# Altium footprint library Fleet-Monitor.PcbLib: 30 footprints (part 1 of 2)
Each footprint in its own frame and in the unit in brackets; x right, y up, seen from the top. Pads: shape width x height; smd on the part's side, far side on the other; paste and mask are expansions set on the pad; w line width, h text height; cw(c..) or ccw(c..) is an arc to the next point about the centre after c.
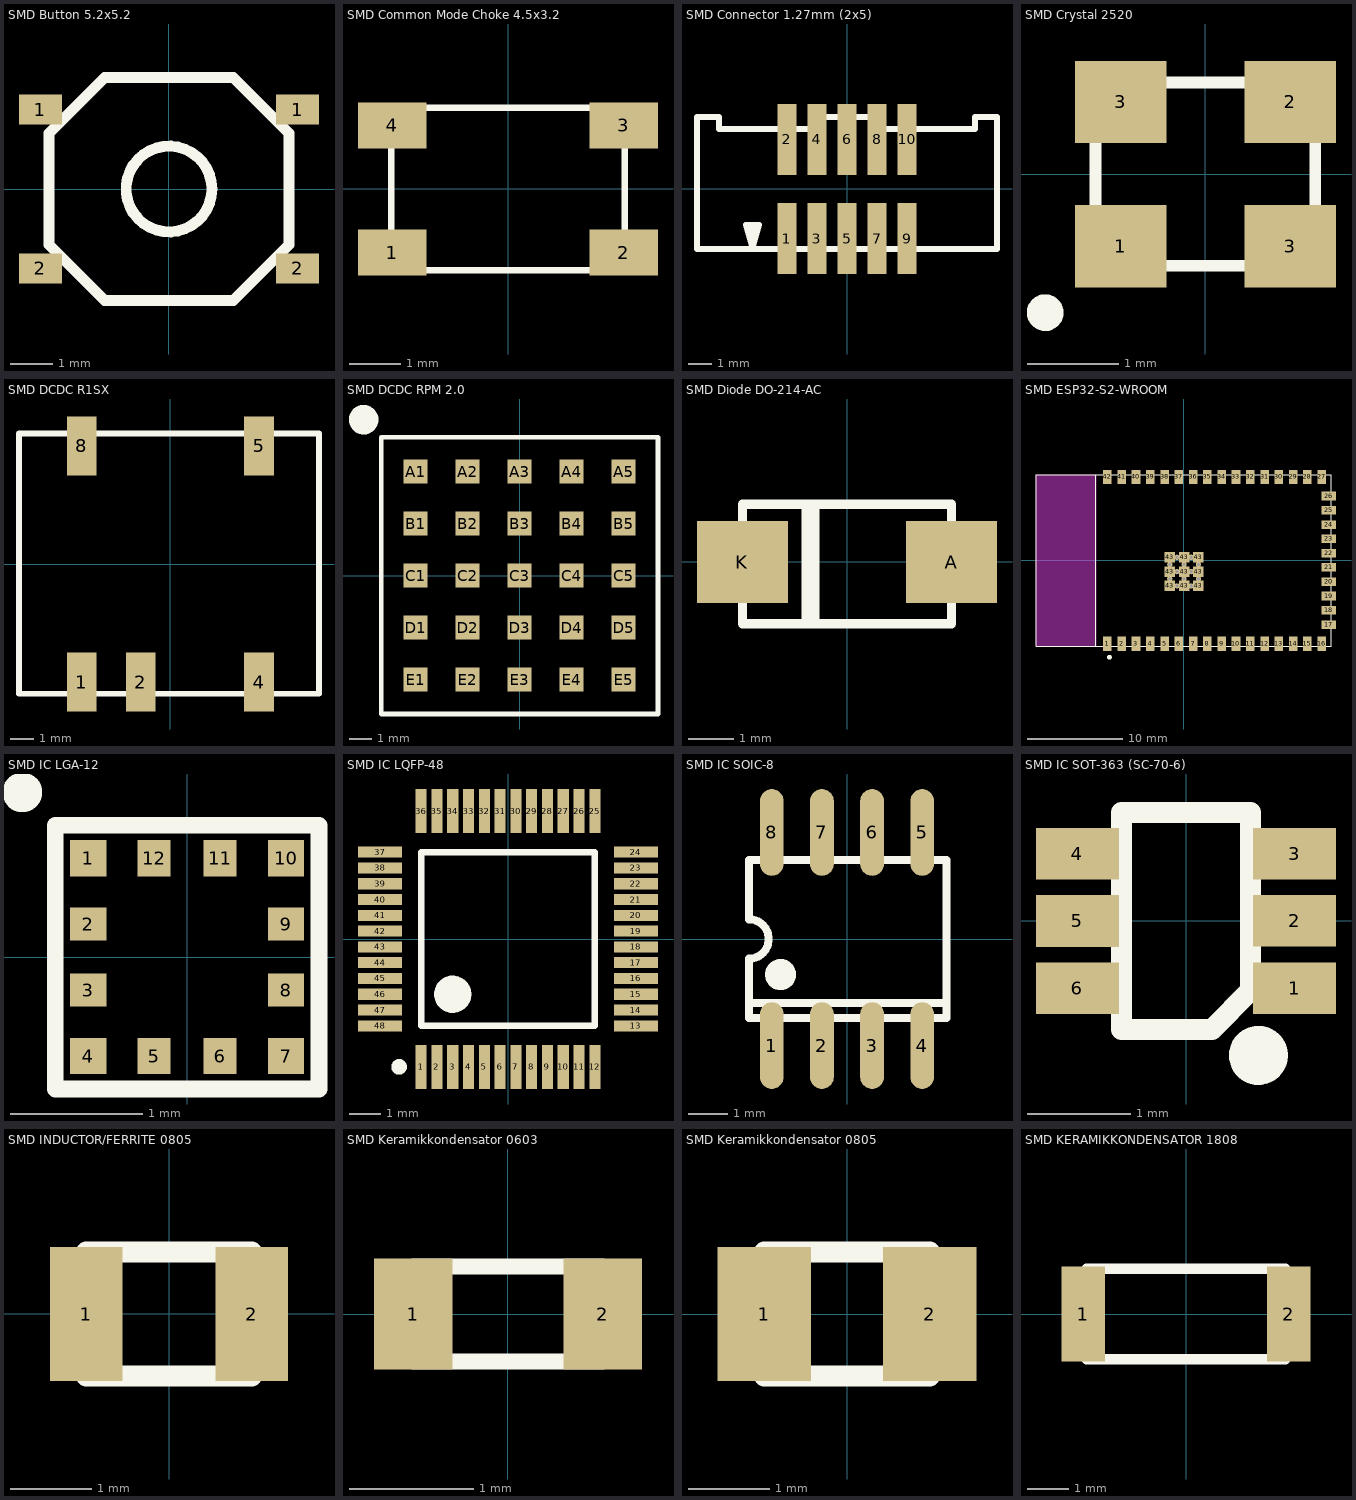
[diagram p0: the footprints below, top view; thin cyan lines are the x and y axes]

## SMD Button 5.2x5.2 [mm]
pads (4):
  rect 1x0.7 smd: 1(-3,1.85) 1(3,1.85) 2(-3,-1.85) 2(3,-1.85)
Top Overlay:
  circle w0.254: c0,0 r1
  lines w0.254: -2.8,-1.3 -1.5,-2.6 0,-2.6 1.5,-2.6 2.8,-1.3 2.8,0 2.8,1.3 1.5,2.6 0,2.6 -1.5,2.6 -2.8,1.3 -2.8,0 -2.8,-1.3
3D body "User Library-LP16.step": height 1.5, standoff 0, extent -3.2,-2.55 3.2,2.55

## SMD Common Mode Choke 4.5x3.2 [mm]
height 1.7
pads (4):
  rect 1.35x0.9 smd: 1(-2.275,-1.25) 2(2.275,-1.25) 3(2.275,1.25) 4(-2.275,1.25)
Top Overlay:
  lines w0.127: -2.3,-1.6 2.3,-1.6 2.3,1.6 -2.3,1.6 -2.3,-1.6
3D body "User Library-ACT45B_GERMANY.step": height 3, standoff 0, extent -2.25,-1.6 2.25,1.6

## SMD Connector 1.27mm (2x5) [mm]
pads (10):
  rect 0.8x3 smd mask+0.051: 1(-2.54,-2.1) 2(-2.54,2.1) 3(-1.27,-2.1) 4(-1.27,2.1) 5(0,-2.1) 6(0,2.1) 7(1.27,-2.1) 8(1.27,2.1) 9(2.54,-2.1) 10(2.54,2.1)
Top Overlay:
  lines w0.203: -4.1,-2 -4.032,-1.962 -3.9,-1.5 ; -4.1,-1.5 -3.902,-2.2 ; -4.3,-1.5 -4,-2.54 -3.7,-1.5 -4.3,-1.5
  lines w0.254: -6.35,-2.54 6.35,-2.54 6.35,3.048 5.41,3.048 5.41,2.54 1.27,2.54 1.27,3.048 -1.27,3.048 -1.27,2.54 -5.41,2.54 -5.41,3.048 -6.35,3.048 -6.35,-2.54
3D body "SHF_105_01_L_D_SM.STEP": height 5.45, standoff -0.01, extent -6.35,-3.048 6.35,3.048

## SMD Crystal 2520 [mm]
height 1.7
pads (4):
  rect 1x0.9 smd: 1(-0.925,-0.787) 2(0.925,0.788) 3(-0.925,0.788) 3(0.925,-0.787)
Top Overlay:
  circle w0.2: c-1.75,-1.512 r0.1
  lines w0.127: -1.2,-1 1.2,-1 1.2,1 -1.2,1 -1.2,-1
3D body "2520 SMD Crystal Oscillator.STEP": height 0.7, standoff 0, extent -1.25,-1 1.25,1

## SMD DCDC R1SX [mm]
height 1.7
pads (5):
  rect 1.27x2.54 smd: 1(-3.81,-5.08) 2(-1.27,-5.08) 4(3.81,-5.08) 5(3.81,5.08) 8(-3.81,5.08)
Top Overlay:
  lines w0.254: -6.51,-5.58 -6.51,5.62 6.39,5.62 6.39,-5.58 -6.51,-5.58
3D body "R1SX.step": height 5.9, standoff 0, extent -6.425,-5.6 6.425,5.6

## SMD DCDC RPM 2.0 [mm]
height 1.7
pads (25):
  rect 1.06x1.06 smd: A1(-4.58,4.58) A2(-2.29,4.58) A3(0,4.58) A4(2.29,4.58) A5(4.58,4.58) B1(-4.58,2.29) B2(-2.29,2.29) B3(0,2.29) B4(2.29,2.29) B5(4.58,2.29) C1(-4.58,0) C2(-2.29,0) C3(0,0) C4(2.29,0) C5(4.58,0) D1(-4.58,-2.29) D2(-2.29,-2.29) D3(0,-2.29) D4(2.29,-2.29) D5(4.58,-2.29) E1(-4.58,-4.58) E2(-2.29,-4.58) E3(0,-4.58) E4(2.29,-4.58) E5(4.58,-4.58)
Top Overlay:
  circle w0.8: c-6.87,6.87 r0.25
  lines w0.2: -6.095,-6.095 6.095,-6.095 6.095,6.095 -6.095,6.095 -6.095,-6.095
3D body "RPMB-3.0.STEP": height 3.95, standoff -0.02, extent -6.345,-6.195 6.345,6.195

## SMD Diode DO-214-AC [mm] "SM LED; 2 Flat Leads"
height 1.3
pads (2):
  rect 2x1.8 smd: A(2.3,0) K(-2.3,0)
Top Overlay:
  lines w0.2: -0.9,-1.328 -0.9,1.2 ; -0.8,-1.328 -0.8,1.2 ; -0.7,-1.328 -0.7,1.2 ; -2.3,-1.358 2.3,-1.358 2.3,1.27 -2.3,1.27 -2.3,-1.358
3D body "User Library-S1G-1.step": height 2.7, standoff 0, extent -2.8,-1.475 2.8,1.475

## SMD ESP32-S2-WROOM [mm]
height 1.7
pads (63):
  rect 0.9x1.5 smd: 1(-8,-8.75) 2(-6.5,-8.75) 3(-5,-8.75) 4(-3.5,-8.75) 5(-2,-8.75) 6(-0.5,-8.75) 7(1,-8.75) 8(2.5,-8.75) 9(4,-8.75) 10(5.5,-8.75) 11(7,-8.75) 12(8.5,-8.75) 13(10,-8.75) 14(11.5,-8.75) 15(13,-8.75) 16(14.5,-8.75) 27(14.5,8.75) 28(13,8.75) 29(11.5,8.75) 30(10,8.75) 31(8.5,8.75) 32(7,8.75) 33(5.5,8.75) 34(4,8.75) 35(2.5,8.75) 36(1,8.75) 37(-0.5,8.75) 38(-2,8.75) 39(-3.5,8.75) 40(-5,8.75) 41(-6.5,8.75) 42(-8,8.75)
  rect 1.5x0.9 smd: 17(15.25,-6.75) 18(15.25,-5.25) 19(15.25,-3.75) 20(15.25,-2.25) 21(15.25,-0.75) 22(15.25,0.75) 23(15.25,2.25) 24(15.25,3.75) 25(15.25,5.25) 26(15.25,6.75)
  rect 1.1x1.1 smd: 43(-1.45,-2.69) 43(-1.45,-1.19) 43(-1.45,0.31) 43(0.05,-2.69) 43(0.05,-1.19) 43(0.05,0.31) 43(1.55,-2.69) 43(1.55,-1.19) 43(1.55,0.31)
  round 0.55 hole 0.3 mask+0.102: 43(-1.45,-1.94) 43(-1.45,-0.44) 43(-0.7,-2.69) 43(-0.7,-1.19) 43(-0.7,0.31) 43(0.05,-1.94) 43(0.05,-0.44) 43(0.8,-2.69) 43(0.8,-1.19) 43(0.8,0.31) 43(1.55,-1.94) 43(1.55,-0.44)
Top Overlay:
  circle w0.3: c-7.788,-10.177 r0.1
  lines w0.127: -9.2,-8.96 -9.2,9 ; -9.2,9 -15.5,9 -15.5,-9 15.5,-9 15.5,9 -9.2,9
Keep-Out Layer:
  region: -9.2,9 -9.2,-9 -15.5,-9 -15.5,9
  region: -9.2,9 -9.2,-9 -15.5,-9 -15.5,9
  region: -9.2,9 -9.2,-9 -15.5,-9 -15.5,9
3D body "step_temp.STEP": height 3.3, standoff 0, extent -15.45,-9 15.55,9

## SMD IC LGA-12 [mm]
height 1.7
pads (12):
  rect 0.275x0.275 smd: 1(-0.75,0.75) 4(-0.75,-0.75) 7(0.75,-0.75) 10(0.75,0.75)
  rect 0.275x0.25 smd: 2(-0.75,0.25) 3(-0.75,-0.25) 8(0.75,-0.25) 9(0.75,0.25)
  rect 0.25x0.275 smd: 5(-0.25,-0.75) 6(0.25,-0.75) 11(0.25,0.75) 12(-0.25,0.75)
Top Overlay:
  circle w0.254: c-1.25,1.25 r0.025
  lines w0.127: -1,-1 1,-1 1,1 -1,1 -1,-1
3D body "User Library-lga-2x2x0_9.step": height 0.95, standoff 0, extent -1,-1 1,1

## SMD IC LQFP-48 [mm]
height 1.6
pads (48):
  rect 0.35x1.4 smd: 1(-2.75,-4.05) 2(-2.25,-4.05) 3(-1.75,-4.05) 4(-1.25,-4.05) 5(-0.75,-4.05) 6(-0.25,-4.05) 7(0.25,-4.05) 8(0.75,-4.05) 9(1.25,-4.05) 10(1.75,-4.05) 11(2.25,-4.05) 12(2.75,-4.05) 25(2.75,4.05) 26(2.25,4.05) 27(1.75,4.05) 28(1.25,4.05) 29(0.75,4.05) 30(0.25,4.05) 31(-0.25,4.05) 32(-0.75,4.05) 33(-1.25,4.05) 34(-1.75,4.05) 35(-2.25,4.05) 36(-2.75,4.05)
  rect 1.4x0.35 smd: 13(4.05,-2.75) 14(4.05,-2.25) 15(4.05,-1.75) 16(4.05,-1.25) 17(4.05,-0.75) 18(4.05,-0.25) 19(4.05,0.25) 20(4.05,0.75) 21(4.05,1.25) 22(4.05,1.75) 23(4.05,2.25) 24(4.05,2.75) 37(-4.05,2.75) 38(-4.05,2.25) 39(-4.05,1.75) 40(-4.05,1.25) 41(-4.05,0.75) 42(-4.05,0.25) 43(-4.05,-0.25) 44(-4.05,-0.75) 45(-4.05,-1.25) 46(-4.05,-1.75) 47(-4.05,-2.25) 48(-4.05,-2.75)
Top Overlay:
  circle w0.25: c-3.45,-4.05 r0.122
  circle w0.6: c-1.75,-1.75 r0.29
  lines w0.2: -2.75,-2.75 2.75,-2.75 2.75,2.75 -2.75,2.75 -2.75,-2.75
3D body "User Library-LQFP48_Grid_0_5.STEP": height 1.6, standoff 0, extent -4.5,-4.5 4.5,4.5

## SMD IC SOIC-8 [mm]
height 1.7
pads (8):
  oval 0.6x2.2 smd: 1(-1.905,-2.7) 2(-0.635,-2.7) 3(0.635,-2.7) 4(1.905,-2.7) 5(1.905,2.7) 6(0.635,2.7) 7(-0.635,2.7) 8(-1.905,2.7)
Top Overlay:
  circle w0.406: c-1.683,-0.9 r0.191
  lines w0.2: -2.483,-2 2.517,-2 2.517,2 -2.483,2 ; -2.483,-1.625 2.517,-1.625
  lines w0.203: -2.483,-2 -2.483,-0.5 ccw(c-2.483,0) -2.483,0.5 -2.483,2
3D body "User Library-SO-8-1.step": height 1.75, standoff 0, extent -2.483,-3.122 2.517,3.122

## SMD IC SOT-363 (SC-70-6) [mm]
height 1.7
pads (6):
  rect 0.8x0.5 smd: 1(1.05,-0.65) 2(1.05,0) 3(1.05,0.65) 4(-1.05,0.65) 5(-1.05,0) 6(-1.05,-0.65)
Top Overlay:
  circle w0.37: c0.7,-1.3 r0.1
  lines w0.203: -0.625,-1.05 0.25,-1.05 0.625,-0.675 0.625,1.05 -0.625,1.05 -0.625,-1.05
3D body "User Library-SC70-6.step": height 0.92, standoff -0.03, extent -1.05,-1 1.05,1

## SMD INDUCTOR/FERRITE 0805 [mil]
height 66.93
pads (2):
  rect 35x65 smd: 1(-40,0) 2(40,0)
Top Overlay:
  lines w10: -40,-30 40,-30 40,30 -40,30 -40,-30
3D body "User Library-ind_0805.step": height 37.4, standoff 0, extent -39.36,-23.62 39.38,23.63

## SMD Keramikkondensator 0603 [mil]
height 66.93
pads (2):
  rect 25x35 smd: 1(-30,0) 2(30,0)
Top Overlay:
  lines w5: -30,-15 -30,15 30,15 30,-15 -30,-15
3D body "User Library-0603_Cap.STEP": height 31.69, standoff 0, extent -31.49,-15.74 31.5,15.75

## SMD Keramikkondensator 0805 [mil]
height 66.93
pads (2):
  rect 45x65 smd: 1(-40,0) 2(40,0)
Top Overlay:
  lines w10: -40,-30 40,-30 40,30 -40,30 -40,-30
3D body "User Library-0805 SMD Capacitor.step": height 30.79, standoff 0, extent -39.36,-24.6 39.38,24.61

## SMD KERAMIKKONDENSATOR 1808 [mm]
pads (2):
  rect 1.05x2.3 smd: 1(-2.5,0) 2(2.5,0)
Top Overlay:
  lines w0.254: -2.413,-1.1 2.413,-1.1 2.413,1.1 -2.413,1.1 -2.413,-1.1
3D body "User Library-Ceramic_Capacitor_1808_h50mil.STEP": height 1.26, standoff 0.01, extent -2.25,-1 2.25,1